# Altium footprint library ARCOM_Connectors.PcbLib: 84 footprints (part 2 of 6)
Each footprint in its own frame and in the unit in brackets; x right, y up, seen from the top. Pads: shape width x height; smd on the part's side, far side on the other; paste and mask are expansions set on the pad; w line width, h text height; cw(c..) or ccw(c..) is an arc to the next point about the centre after c.
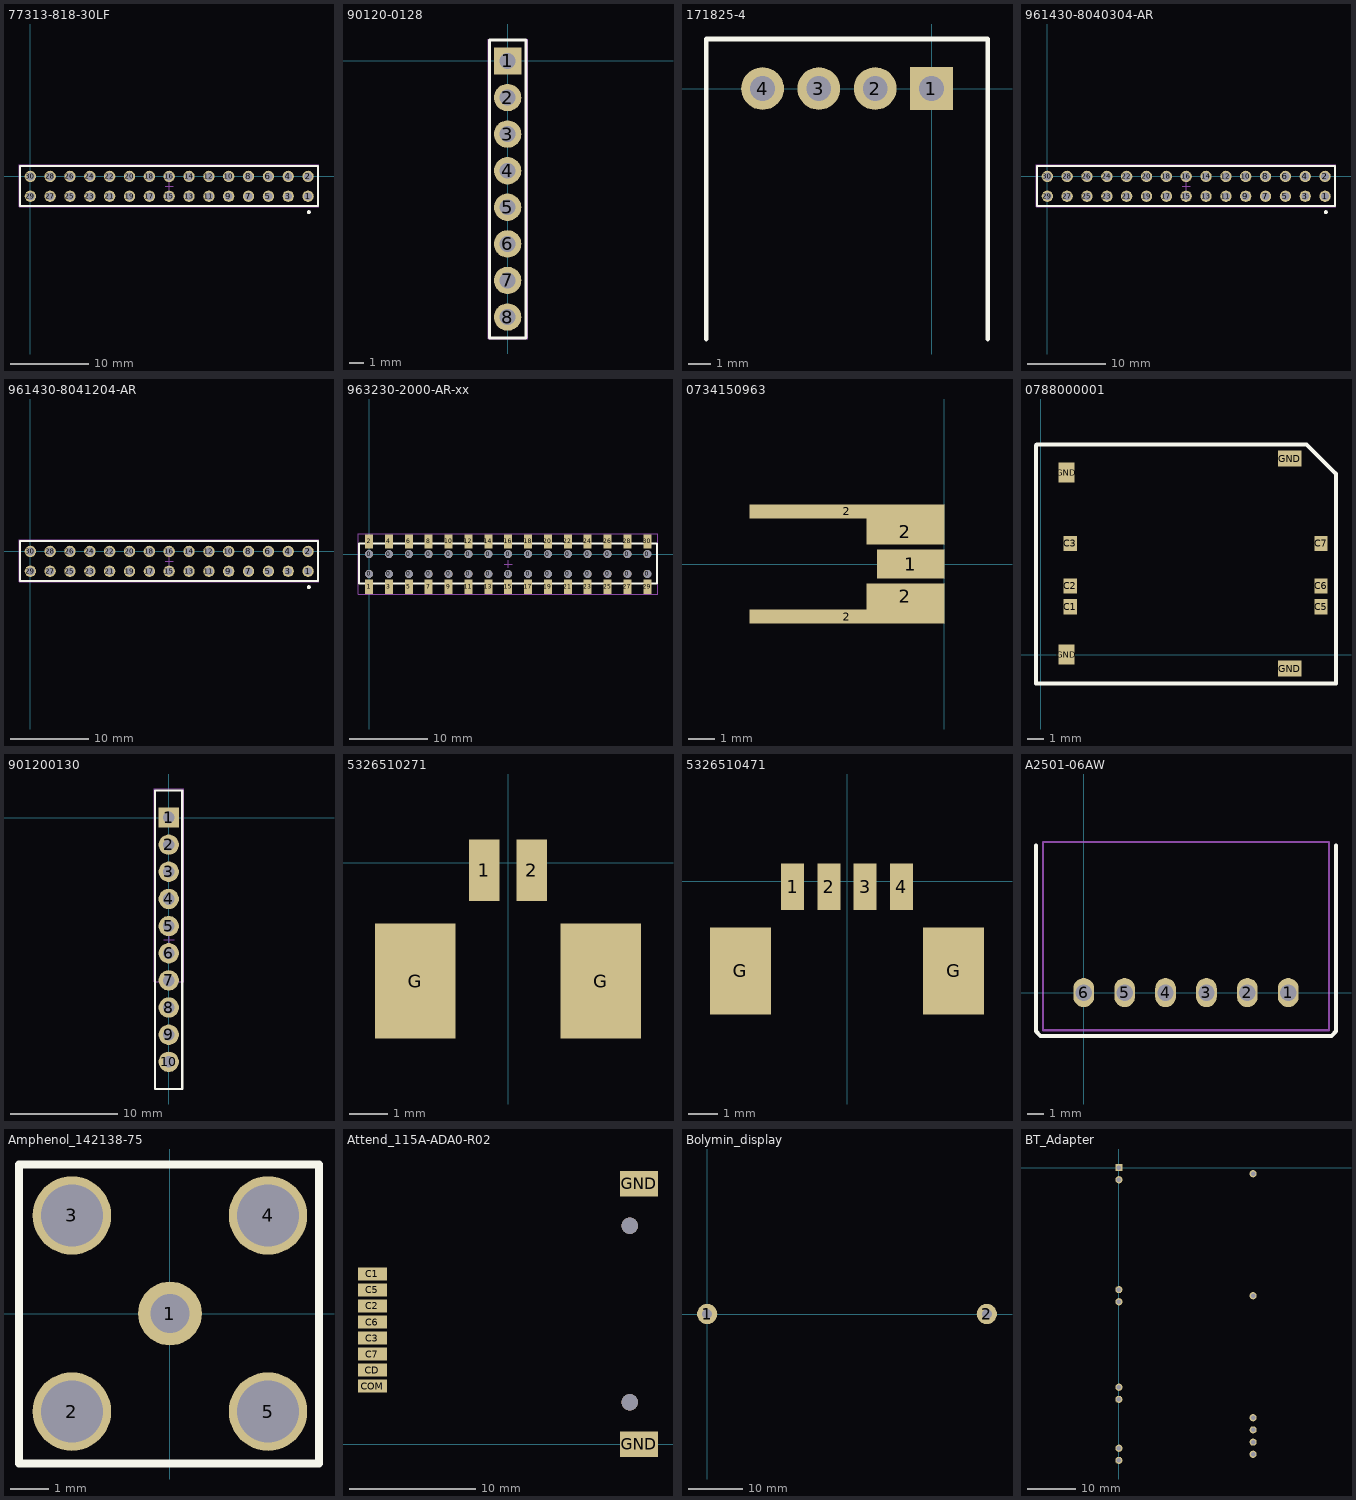
[diagram p1: the footprints below, top view; thin cyan lines are the x and y axes]

## 77313-818-30LF [mm]
pads (30):
  round 1.45 hole 1.02: 1(35.56,-2.54) 2(35.56,0) 3(33.02,-2.54) 4(33.02,0) 5(30.48,-2.54) 6(30.48,0) 7(27.94,-2.54) 8(27.94,0) 9(25.4,-2.54) 10(25.4,0) 11(22.86,-2.54) 12(22.86,0) 13(20.32,-2.54) 14(20.32,0) 15(17.78,-2.54) 16(17.78,0) 17(15.24,-2.54) 18(15.24,0) 19(12.7,-2.54) 20(12.7,0) 21(10.16,-2.54) 22(10.16,0) 23(7.62,-2.54) 24(7.62,0) 25(5.08,-2.54) 26(5.08,0) 27(2.54,-2.54) 28(2.54,0) 29(0,-2.54) 30(0,0)
Top Overlay:
  circle w0.254: c35.662,-4.572 r0.127
  lines w0.254: -1.295,-3.759 -1.295,1.321 36.805,1.321 36.805,-3.759 -1.295,-3.759
M15 Top Assy:
  lines w0.05: -1.448,-3.912 36.957,-3.912 36.957,1.473 -1.448,1.473 -1.448,-3.912
  lines w0.1: 17.28,-1.27 18.28,-1.27 ; 17.78,-1.77 17.78,-0.77
3D body "Pin Header 2x15 TH Pitch 2.54mm.stp": height 9.5, standoff -3.2, extent -1.295,-3.759 36.805,1.321

## 90120-0128 [mm] "Molex, 8 pin"
pads (8):
  rect 1.9x1.9 hole 1.1: 1(0,0)
  round 1.9 hole 1.1: 2(0,-2.54) 3(0,-5.08) 4(0,-7.62) 5(0,-10.16) 6(0,-12.7) 7(0,-15.24) 8(0,-17.78)
Top Overlay:
  lines w0.2: -1.27,1.423 -1.27,-19.228 1.27,-19.228 1.27,1.423 ; -1.27,1.448 1.27,1.448
M15 Top Assy:
  lines w0.05: -1.35,-19.304 -1.35,1.524 1.4,1.524 1.4,-19.304 -1.35,-19.304
  lines w0.1: -0.475,-7.62 0.525,-7.62 ; 0.025,-8.12 0.025,-7.12
3D body "901200128.stp": height 9.32, standoff -2.79, extent -1.25,-18.897 1.25,1.423

## 171825-4 [mm]
pads (4):
  rect 1.9x1.9 hole 1.1: 1(-0.025,0)
  round 1.9 hole 1.1: 2(-2.525,0) 3(-5.025,0) 4(-7.525,0)
Top Overlay:
  lines w0.2: -10.025,-11.125 -10.025,2.2 2.475,2.2 2.475,-11.125
3D body "Power_65874.STEP": height 5.9, standoff -2.9, extent -8.839,-13.192 1.321,0.328

## 961430-8040304-AR [mm]
pads (30):
  round 1.45 hole 1.02: 1(35.56,-2.54) 2(35.56,0) 3(33.02,-2.54) 4(33.02,0) 5(30.48,-2.54) 6(30.48,0) 7(27.94,-2.54) 8(27.94,0) 9(25.4,-2.54) 10(25.4,0) 11(22.86,-2.54) 12(22.86,0) 13(20.32,-2.54) 14(20.32,0) 15(17.78,-2.54) 16(17.78,0) 17(15.24,-2.54) 18(15.24,0) 19(12.7,-2.54) 20(12.7,0) 21(10.16,-2.54) 22(10.16,0) 23(7.62,-2.54) 24(7.62,0) 25(5.08,-2.54) 26(5.08,0) 27(2.54,-2.54) 28(2.54,0) 29(0,-2.54) 30(0,0)
Top Overlay:
  circle w0.254: c35.662,-4.572 r0.127
  lines w0.254: -1.295,-3.759 36.805,-3.759 36.805,1.321 -1.295,1.321 -1.295,-3.759
M15 Top Assy:
  lines w0.05: -1.448,-3.912 36.957,-3.912 36.957,1.473 -1.448,1.473 -1.448,-3.912
  lines w0.1: 17.28,-1.27 18.28,-1.27 ; 17.78,-1.77 17.78,-0.77
3D body "961430-8040304-XX.stp": height 15.22, standoff -3.28, extent -1.295,-3.745 36.805,1.255

## 961430-8041204-AR [mm]
pads (30):
  round 1.45 hole 1.02: 1(35.56,-2.54) 2(35.56,0) 3(33.02,-2.54) 4(33.02,0) 5(30.48,-2.54) 6(30.48,0) 7(27.94,-2.54) 8(27.94,0) 9(25.4,-2.54) 10(25.4,0) 11(22.86,-2.54) 12(22.86,0) 13(20.32,-2.54) 14(20.32,0) 15(17.78,-2.54) 16(17.78,0) 17(15.24,-2.54) 18(15.24,0) 19(12.7,-2.54) 20(12.7,0) 21(10.16,-2.54) 22(10.16,0) 23(7.62,-2.54) 24(7.62,0) 25(5.08,-2.54) 26(5.08,0) 27(2.54,-2.54) 28(2.54,0) 29(0,-2.54) 30(0,0)
Top Overlay:
  circle w0.254: c35.662,-4.572 r0.127
  lines w0.254: -1.295,-3.759 36.805,-3.759 36.805,1.321 -1.295,1.321 -1.295,-3.759
M15 Top Assy:
  lines w0.05: -1.448,-3.912 36.957,-3.912 36.957,1.473 -1.448,1.473 -1.448,-3.912
  lines w0.1: 17.28,-1.27 18.28,-1.27 ; 17.78,-1.77 17.78,-0.77
3D body "961430-8041204-XX.x_t": height 19.13, standoff -3.27, extent -1.27,-3.745 36.83,1.255

## 963230-2000-AR-xx [mm]
height 8.25
pads (60):
  round 1.02 hole 1.02 unplated: 0(0,-2.54) 0(0,0) 0(2.54,-2.54) 0(2.54,0) 0(5.08,-2.54) 0(5.08,0) 0(7.62,-2.54) 0(7.62,0) 0(10.16,-2.54) 0(10.16,0) 0(12.7,-2.54) 0(12.7,0) 0(15.24,-2.54) 0(15.24,0) 0(17.78,-2.54) 0(17.78,0) 0(20.32,-2.54) 0(20.32,0) 0(22.86,-2.54) 0(22.86,0) 0(25.4,-2.54) 0(25.4,0) 0(27.94,-2.54) 0(27.94,0) 0(30.48,-2.54) 0(30.48,0) 0(33.02,-2.54) 0(33.02,0) 0(35.56,-2.54) 0(35.56,0)
  rect 1.02x1.82 smd: 1(0,-4.166) 2(0,1.614) 3(2.54,-4.166) 4(2.54,1.614) 5(5.08,-4.166) 6(5.08,1.614) 7(7.62,-4.166) 8(7.62,1.614) 9(10.16,-4.166) 10(10.16,1.614) 11(12.7,-4.166) 12(12.7,1.614) 13(15.24,-4.166) 14(15.24,1.614) 15(17.78,-4.166) 16(17.78,1.614) 17(20.32,-4.166) 18(20.32,1.614) 19(22.86,-4.166) 20(22.86,1.614) 21(25.4,-4.166) 22(25.4,1.614) 23(27.94,-4.166) 24(27.94,1.614) 25(30.48,-4.166) 26(30.48,1.614) 27(33.02,-4.166) 28(33.02,1.614) 29(35.56,-4.166) 30(35.56,1.614)
Top Overlay:
  circle w0.254: c-0.051,-4.674 r0.127
  lines w0.254: -1.295,-3.759 -1.295,1.321 36.805,1.321 36.805,-3.759 -1.295,-3.759
M15 Top Assy:
  lines w0.05: -1.422,-5.156 36.932,-5.156 36.932,2.616 -1.422,2.616 -1.422,-5.156
  lines w0.1: 17.28,-1.27 18.28,-1.27 ; 17.78,-1.77 17.78,-0.77
3D body "963230-2000-XX-XX.stp": height 7.43, standoff 0.04, extent -1.295,-4.543 36.805,2.057

## 0734150963 [mm] "MMCX For 1.6mm PCB thickness"
pads (5):
  rect 2.6x1.1 smd mask+0: 1(-1.3,0)
  rect 7.5x0.55 smd mask+0: 2(-3.75,-2.025) 2(-3.75,2.025)
  rect 3x1 smd mask+0: 2(-1.5,-1.25) 2(-1.5,1.25)
3D body "734150963.stp": height 2.11, standoff -1.39, extent -7.453,-2.264 -0.014,2.235

## 0788000001 [mm]
pads (10):
  rect 0.8x0.9 smd: C1(1.77,2.85) C2(1.77,4.09) C3(1.77,6.63) C5(16.71,2.85) C6(16.71,4.09) C7(16.71,6.63)
  rect 0.95x1.2 smd: GND(1.54,0) GND(1.54,10.85)
  rect 1.4x0.95 smd: GND(14.85,-0.84) GND(14.85,11.68)
Top Overlay:
  lines w0.254: -0.279,-1.727 17.602,-1.727 17.602,10.77 15.85,12.522 -0.229,12.522 -0.279,12.471 -0.279,-1.727
3D body "788000001.stp": height 1.5, standoff 0, extent -0.047,-1.54 16.913,12.31

## 901200130 [mm] "Molex 90120-0130, 10-pin"
pads (10):
  rect 1.9x1.9 hole 1.1: 1(0,0)
  round 1.9 hole 1.1: 2(0,-2.54) 3(0,-5.08) 4(0,-7.62) 5(0,-10.16) 6(0,-12.7) 7(0,-15.24) 8(0,-17.78) 9(0,-20.32) 10(0,-22.86)
Top Overlay:
  lines w0.2: -1.27,-25.4 -1.27,2.54 1.27,2.54 1.27,-25.4 -1.27,-25.4
M15 Top Assy:
  lines w0.05: -1.35,-15.367 1.4,-15.367 1.4,2.667 -1.35,2.667 -1.35,-15.367
  lines w0.1: -0.475,-11.455 0.525,-11.455 ; 0.025,-11.955 0.025,-10.955
3D body "901200130.stp": height 9.27, standoff -2.84, extent -1.25,-24.13 1.25,1.27

## 5326510271 [mm]
pads (4):
  rect 0.8x1.6 smd: 1(-0.625,-0.2) 2(0.625,-0.2)
  rect 2.1x3 smd: G(-2.425,-3.1) G(2.425,-3.1)
3D body "532610271.stp": height 3.4, standoff 0, extent -3.876,-5.2 3.774,0

## 5326510471 [mm]
pads (6):
  rect 0.8x1.6 smd: 1(-1.875,-0.2) 2(-0.625,-0.2) 3(0.625,-0.2) 4(1.875,-0.2)
  rect 2.1x3 smd: G(-3.675,-3.1) G(3.675,-3.1)
3D body "532610471.stp": height 3.4, standoff 0, extent -5.075,-5.217 5.075,-0.017

## A2501-06AW [mm] "aka S6B-XH-A, 2317RJ-06 or WK-06R"
pads (6):
  oval 1.27x1.778 hole 1: 1(12.5,0) 2(10,0) 3(7.5,0) 4(5,0) 5(2.5,0) 6(0,0)
Top Overlay:
  lines w0.254: -2.921,8.992 -2.921,-2.362 -2.642,-2.642 15.142,-2.642 15.421,-2.362 15.421,8.992
Mechanical 1:
  lines w0.127: -2.5,0 -2.5,9.195 ; -2.5,9.2 2.5,9.2 15,9.2 15,0 15,-2.3 0,-2.3 -2.5,-2.3 -2.5,0
  text "PCB edge" at 2.997,8.128 h0.76

## Amphenol_142138-75 [mil]
pads (5):
  round 65 hole 39.37: 1(0,0)
  round 80 hole 62.99: 2(-100,-100) 3(-100,100) 4(100,100) 5(100,-100)
Top Overlay:
  lines w7.87: -154,-153 152,-153 152,152 -154,152 -154,-153
3D body "1-1337482-0.STEP": height 300, standoff -152.76, extent -139.79,-138.79 135.8,136.8

## Attend_115A-ADA0-R02 [mm]
pads (10):
  rect 2.3x1 smd: C1(-26.4,13.5) C2(-26.4,10.96) C3(-26.4,8.42) C5(-26.4,12.23) C6(-26.4,9.69) C7(-26.4,7.15) CD(-26.4,5.88) COM(-26.4,4.61)
  rect 3x2 smd: GND(-5.25,0) GND(-5.25,20.65)
via -6,17.325 diameter 1.3 hole 1.3
via -6,3.325 diameter 1.3 hole 1.3
3D body "ATTEND_SIM.step": height 1.84, standoff -0.7, extent -26.886,-0.127 0.064,20.823

## Bolymin_display [mm]
pads (2):
  round 3.7 hole 1.8: 1(0,0) 2(51.05,0)
via 53.107,42.037 diameter 1.4 hole 1.4
via -2.057,42.037 diameter 1.4 hole 1.4
3D body "Display_release.STEP": height 4.9, standoff -2.6, extent -3.708,-5.766 54.692,43.734

## BT_Adapter [mm] "Connector; Header; 25 Position"
pads (14):
  rect 1.5x1.5 hole 0.9: 1(0,0)
  round 1.5 hole 0.9: 2(0,-2.54) 11(0,-25.4) 12(0,-27.94) 19(0,-45.72) 20(0,-48.26) 24(0,-58.42) 25(0,-60.96) 26(27.94,-59.69) 27(27.94,-57.15) 28(27.94,-54.61) 29(27.94,-52.07) 39(27.94,-26.67) 49(27.94,-1.27)